# Altium footprint library Main.PcbLib: 50 footprints (part 3 of 4)
Each footprint in its own frame and in the unit in brackets; x right, y up, seen from the top. Pads: shape width x height; smd on the part's side, far side on the other; paste and mask are expansions set on the pad; w line width, h text height; cw(c..) or ccw(c..) is an arc to the next point about the centre after c.
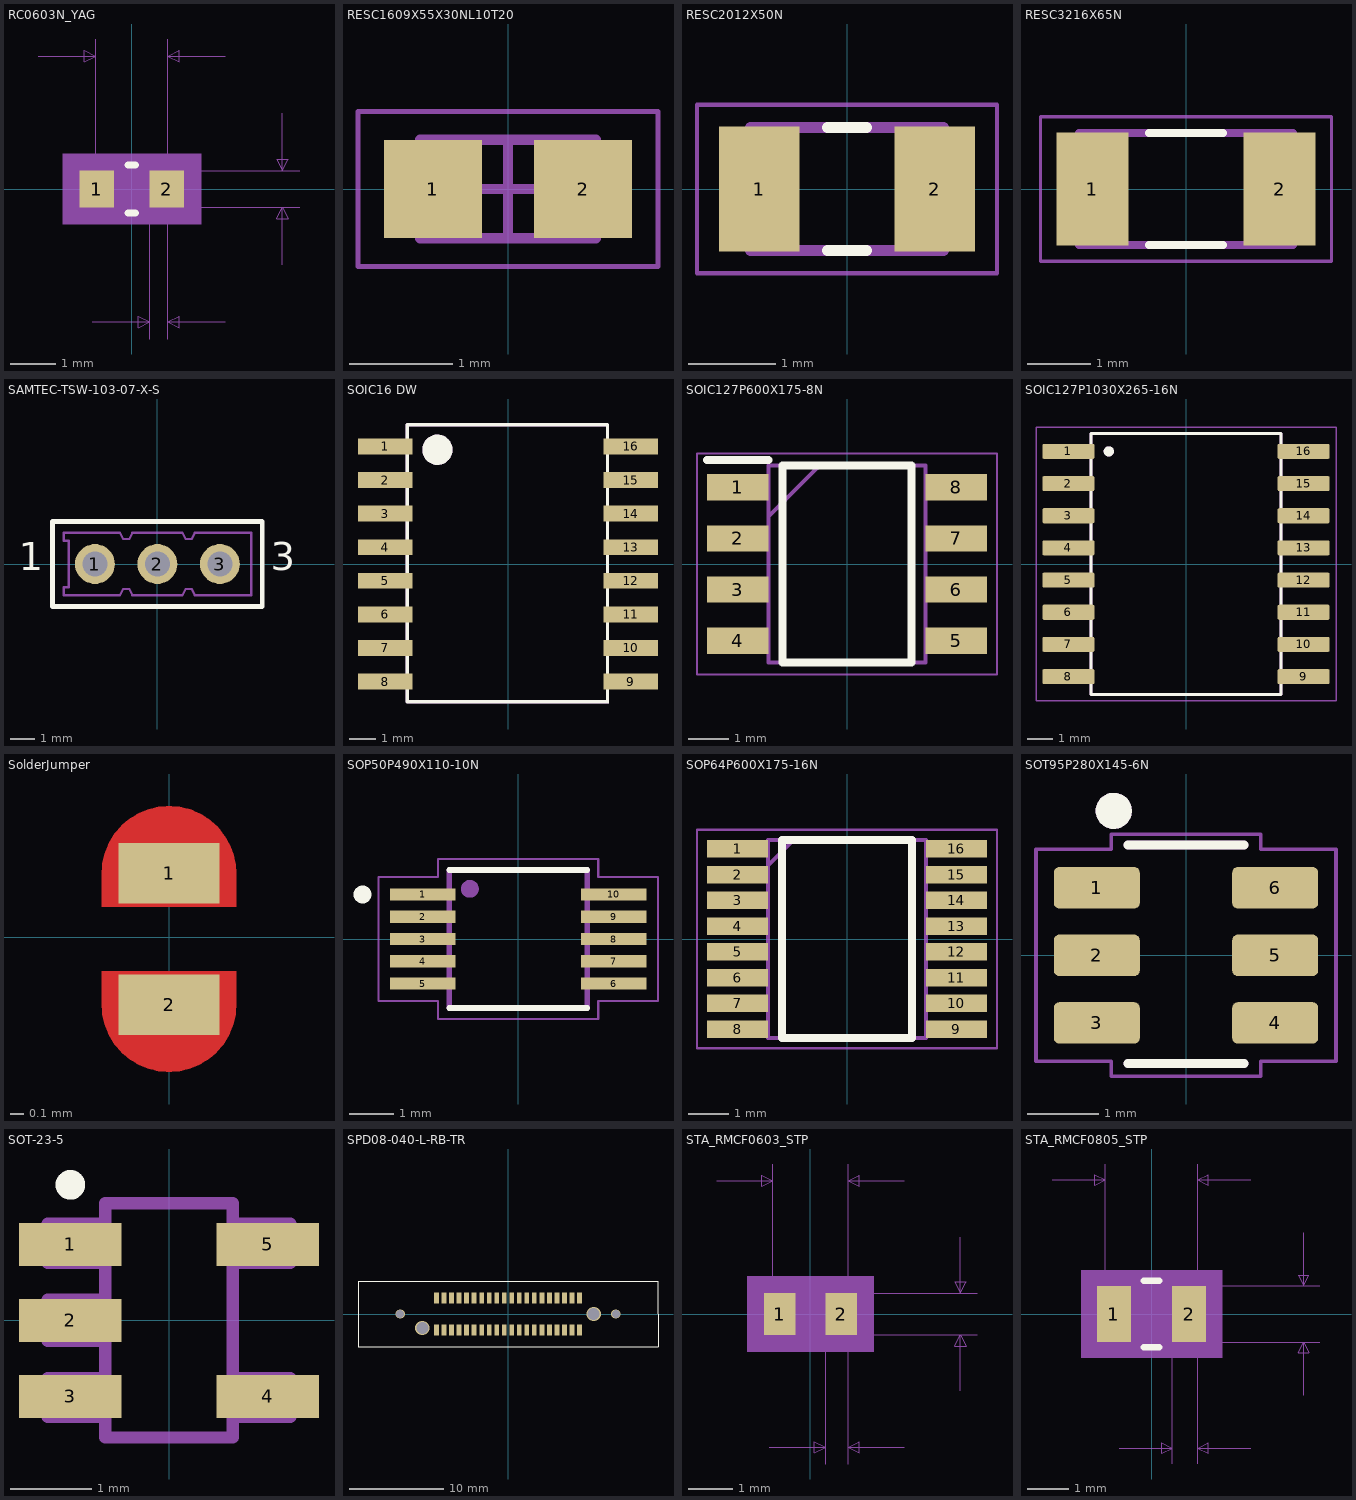
[diagram p2: the footprints below, top view; thin cyan lines are the x and y axes]

## RC0603N_YAG [mil]
pads (2):
  rect 30x32 smd paste+0 mask+0: 1(-30.5,0) 2(30.5,0)
Top Overlay:
  lines w6: -3.39,-21 3.39,-21 ; -3.39,21 3.39,21
Mechanical 5:
  region: 60.5,-31 -60.5,-31 -60.5,31 60.5,31
Mechanical 7:
  lines w1: -81.5,116 -31.5,116 ; -34.5,-116 15.5,-116 ; -31.5,0 -31.5,131 ; 0,-16 146.5,-16 ; 0,16 146.5,16 ; 15.5,-131 15.5,0 ; 31.5,-131 31.5,0 31.5,131 ; 81.5,-116 31.5,-116 ; 81.5,116 31.5,116 ; 131.5,-66 131.5,-16 ; 131.5,66 131.5,16 ; -31.5,116 -41.5,121 -41.5,111 -31.5,116 ; 15.5,-116 5.5,-111 5.5,-121 15.5,-116 ; 31.5,-116 41.5,-111 41.5,-121 31.5,-116 ; 31.5,116 41.5,121 41.5,111 31.5,116 ; 131.5,-16 126.5,-26 136.5,-26 131.5,-16 ; 131.5,16 126.5,26 136.5,26 131.5,16
  text "Default Padstyle: RX30Y32D0T" at -350,-286 h50
  text "Alternate 1 Padstyle: OX60Y90D30P" at -412.5,-386 h50
  text "Alternate 2 Padstyle: OX90Y60D30P" at -412.5,-486 h50
  text "0.032in/0.813mm" at 151.5,-12.5 h25
  text "0.063in/1.6mm" at -81.25,136 h25
  text "0.016in/0.406mm" at -70.25,-161 h25
Mechanical 13:
  lines w1: -31.5,-16 -31.5,16 ; -31.5,-16 -15.5,-16 -15.5,16 -31.5,16 ; -31.5,-16 31.5,-16 ; -31.5,-16 -31.5,16 ; -31.5,16 31.5,16 ; 31.5,-16 15.5,-16 15.5,16 31.5,16 ; 31.5,-16 31.5,16 ; 31.5,-16 31.5,16
Mechanical 15:
  region: 55.5,-26 -55.5,-26 -55.5,26 55.5,26
  lines w6: -55.5,-26 -55.5,26 55.5,26 55.5,-26 -55.5,-26
3D body: height 10, standoff 0, extent 0,0 10,10

## RESC1609X55X30NL10T20 [mm]
pads (2):
  rect 0.95x0.95 smd: 1(-0.725,0) 2(0.725,0)
Mechanical 13:
  lines w0.1: -0.85,-0.475 -0.85,0.475 0.85,0.475 0.85,-0.475 -0.85,-0.475
Mechanical 15:
  lines w0.05: -1.45,-0.75 -1.45,0.75 1.45,0.75 1.45,-0.75 -1.45,-0.75
  lines w0.1: -0.475,0 0.475,0 ; 0,-0.475 0,0.475
3D body: height 0.55, standoff 0, extent -0.55,-0.475 0.55,0.475
3D body: height 0.55, standoff 0, extent -0.85,-0.475 -0.55,0.475
3D body: height 0.55, standoff 0, extent 0.55,-0.475 0.85,0.475

## RESC2012X50N [mm]
pads (2):
  rect 0.92x1.42 smd: 1(-1,0) 2(1,0)
Top Overlay:
  lines w0.127: -0.22,-0.7 0.22,-0.7 ; -0.22,0.7 0.22,0.7
Mechanical 13:
  lines w0.127: -1.1,-0.7 -1.1,0.7 1.1,0.7 1.1,-0.7 -1.1,-0.7
Mechanical 15:
  lines w0.05: -1.71,-0.96 -1.71,0.96 1.71,0.96 1.71,-0.96 -1.71,-0.96

## RESC3216X65N [mm]
pads (2):
  rect 1.13x1.77 smd: 1(-1.47,0) 2(1.47,0)
Top Overlay:
  lines w0.127: -0.58,-0.88 0.58,-0.88 ; -0.58,0.88 0.58,0.88
Mechanical 13:
  lines w0.127: -1.68,-0.88 -1.68,0.88 1.68,0.88 1.68,-0.88 -1.68,-0.88
Mechanical 15:
  lines w0.05: -2.285,-1.135 -2.285,1.135 2.285,1.135 2.285,-1.135 -2.285,-1.135

## SAMTEC-TSW-103-07-X-S [mm]
pads (3):
  round 1.62 hole 1.02: 1(-2.54,0) 2(0,0) 3(2.54,0)
Top Overlay:
  lines w0.2: -4.26,-1.72 4.26,-1.72 4.26,1.72 -4.26,1.72 -4.26,-1.72
  text "3" at 4.601,-0.635 h1.97
  text "1" at -5.63,-0.635 h1.97
Top Solder:
  circle w0: c2.54,0 r0.861
  circle w0: c0,0 r0.861
  circle w0: c-2.54,0 r0.861
Bottom Solder:
  circle w0: c2.54,0 r0.861
  circle w0: c0,0 r0.861
  circle w0: c-2.54,0 r0.861
Mechanical 16:
  lines w0.1: -3.81,-1.27 -1.524,-1.27 -1.4,-1.016 -1.27,-1.016 -1.14,-1.016 -1.016,-1.27 1.016,-1.27 1.14,-1.016 1.27,-1.016 1.4,-1.016 1.524,-1.27 3.81,-1.27 3.81,1.27 1.524,1.27 1.4,1.016 1.27,1.016 1.14,1.016 1.016,1.27 -1.016,1.27 -1.14,1.016 -1.27,1.016 -1.4,1.016 -1.524,1.27 -3.81,1.27 -3.81,0.94 -3.607,0.94 -3.607,-0.94 -3.81,-0.94 -3.81,-1.27 ; -2.858,-0.318 -2.222,-0.318 -2.222,0.318 -2.858,0.318 -2.858,-0.318 ; -0.318,-0.318 0.318,-0.318 0.318,0.318 -0.318,0.318 -0.318,-0.318 ; 2.222,-0.318 2.858,-0.318 2.858,0.318 2.222,0.318 2.222,-0.318
  text "3" at 4.601,-0.635 h1.97
  text "1" at -5.63,-0.635 h1.97
Mechanical 42:
  lines w0.1: -4.26,-1.72 4.26,-1.72 4.26,1.72 -4.26,1.72 -4.26,-1.72
3D body "TSW-103-07-F-S.stp": height 7.89, standoff -3.04, extent -3.81,-1.27 3.937,1.27

## SOIC16 DW [mm]
pads (16):
  rect 2.06x0.6 smd: 1(-4.64,4.445) 2(-4.64,3.175) 3(-4.64,1.905) 4(-4.64,0.635) 5(-4.64,-0.635) 6(-4.64,-1.905) 7(-4.64,-3.175) 8(-4.64,-4.445) 9(4.64,-4.445) 10(4.64,-3.175) 11(4.64,-1.905) 12(4.64,-0.635) 13(4.64,0.635) 14(4.64,1.905) 15(4.64,3.175) 16(4.64,4.445)
Top Overlay:
  circle w0.635: c-2.667,4.318 r0.254
  lines w0: -3.8,-5.25 3.8,-5.25
  lines w0.127: -3.81,-5.209 3.759,-5.209 3.759,5.258 -3.81,5.258 -3.81,-5.209
Mechanical 4:
  lines w0: -3.8,-5.25 -3.8,5.25 ; -3.8,-5.25 3.8,-5.25 ; -3.8,-5.25 -3.8,5.25 ; -3.8,-5.25 3.8,-5.25 ; -3.8,5.25 3.8,5.25 ; -3.8,5.25 3.8,5.25 ; 3.8,-5.25 3.8,5.25 ; 3.8,-5.25 3.8,5.25
Mechanical 29:
  circle w0.635: c-2.667,4.318 r0.254
  lines w0: -3.8,-5.25 3.8,-5.25
  lines w0.127: -3.81,-5.209 3.759,-5.209 3.759,5.258 -3.81,5.258 -3.81,-5.209
  text "'.Designator'String" at -3.456,-4.62 h0.7
3D body "ISO7240ADW.STEP": height 2.36, standoff -0.29, extent -5.15,-5.15 5.15,5.15

## SOIC127P600X175-8N [mm]
pads (8):
  rect 1.525x0.65 smd: 1(-2.712,1.905) 2(-2.712,0.635) 3(-2.712,-0.635) 4(-2.712,-1.905) 5(2.712,-1.905) 6(2.712,-0.635) 7(2.712,0.635) 8(2.712,1.905)
Top Overlay:
  lines w0.2: -3.475,2.58 -1.95,2.58 ; -1.6,-2.45 1.6,-2.45 1.6,2.45 -1.6,2.45 -1.6,-2.45
Mechanical 13:
  lines w0.1: -1.95,1.18 -0.68,2.45 ; -1.95,-2.45 1.95,-2.45 1.95,2.45 -1.95,2.45 -1.95,-2.45
Mechanical 15:
  lines w0.05: -3.725,-2.75 3.725,-2.75 3.725,2.75 -3.725,2.75 -3.725,-2.75
3D body "NE555DR.stp": height 1.75, standoff 0, extent -3,-2.45 3,2.45

## SOIC127P1030X265-16N [mm]
pads (16):
  rrect25% 2.06x0.6 smd: 1(-4.64,4.445) 2(-4.64,3.175) 3(-4.64,1.905) 4(-4.64,0.635) 5(-4.64,-0.635) 6(-4.64,-1.905) 7(-4.64,-3.175) 8(-4.64,-4.445) 9(4.64,-4.445) 10(4.64,-3.175) 11(4.64,-1.905) 12(4.64,-0.635) 13(4.64,0.635) 14(4.64,1.905) 15(4.64,3.175) 16(4.64,4.445)
Top Overlay:
  circle w0.2: c-3.048,4.445 r0.1
  lines w0.127: -3.75,-5.15 -3.75,5.15 3.75,5.15 3.75,-5.15 -3.75,-5.15
Mechanical 13:
  circle w0.2: c-3.048,4.445 r0.1
  lines w0.127: -3.75,-5.15 -3.75,5.15 3.75,5.15 3.75,-5.15 -3.75,-5.15
Mechanical 15:
  lines w0.05: -5.92,-5.4 -5.92,5.4 5.92,5.4 5.92,-5.4 -5.92,-5.4
Mechanical 29:
  circle w0.2: c-3.048,4.445 r0.1
  lines w0.127: -3.75,-5.15 -3.75,5.15 3.75,5.15 3.75,-5.15 -3.75,-5.15
  text "'.Designator'String" at -3.456,-4.62 h0.7
3D body "ISO7710DW.STEP": height 2.36, standoff -0.29, extent -5.15,-5.15 5.15,5.15

## SolderJumper [mil]
pads (2):
  rect 30x18 smd paste+0 mask+0: 1(0,19) 2(0,-20)
Top Layer:
  region: 20,-10 -20,-10 -20,-20 20,-20
  rectangle: -20,9 20,19
  region: -15,-20 -10,-20 0,-10 10,-10 10,-26.03 12.4,-28.44 6.94,-33.9 -5.64,-33.9
  region: -3.62,33.56 -15,22.17 -15,19 20,9 8.19,25.81 8.19,31.57
  lines w10: -15,-20 ccw(c0,-20) -10.61,-30.6 ; -15,19 cw(c0,19) 0,34 cw(c0,19) 13.75,25 cw(c0,19) 15,19 ; 15,-20 cw(c0,-20) 0,-35 cw(c0,-20) -10.6,-30.61 ; -10.61,-30.6 ccw(c0,-20) -10.61,-30.61 ; -10.61,-30.61 ccw(c0,-20) -10.6,-30.61
Top Solder:
  region: 25,-6 25,-30 10,-45 -10,-45 -15,-40 -25,-30 -25,-6
  region: -25,5 -25,29 -10,44 10,44 15,39 25,29 25,5

## SOP50P490X110-10N [mm]
pads (10):
  rect 1.47x0.28 smd mask+0.04: 1(-2.15,1) 2(-2.15,0.5) 3(-2.15,0) 4(-2.15,-0.5) 5(-2.15,-1) 6(2.15,-1) 7(2.15,-0.5) 8(2.15,0) 9(2.15,0.5) 10(2.15,1)
Top Overlay:
  circle w0.2: c-3.5,1 r0.1
  lines w0.127: -1.55,-1.55 1.55,-1.55 ; -1.55,1.55 1.55,1.55
Mechanical 13:
  circle w0.2: c-1.087,1.127 r0.1
  lines w0.127: -1.55,-1.55 -1.55,1.55 1.55,1.55 1.55,-1.55 -1.55,-1.55
Mechanical 15:
  lines w0.05: -3.14,-1.39 -3.14,1.39 -1.8,1.39 -1.8,1.8 1.8,1.8 1.8,1.39 3.14,1.39 3.14,-1.39 1.8,-1.39 1.8,-1.8 -1.8,-1.8 -1.8,-1.39 -3.14,-1.39

## SOP64P600X175-16N [mm]
pads (16):
  rect 1.5x0.435 smd mask+0.025: 1(-2.7,2.222) 2(-2.7,1.588) 3(-2.7,0.952) 4(-2.7,0.318) 5(-2.7,-0.318) 6(-2.7,-0.952) 7(-2.7,-1.588) 8(-2.7,-2.222) 9(2.7,-2.222) 10(2.7,-1.588) 11(2.7,-0.952) 12(2.7,-0.318) 13(2.7,0.318) 14(2.7,0.952) 15(2.7,1.588) 16(2.7,2.222)
Top Overlay:
  lines w0.2: -1.6,-2.445 -1.6,2.445 1.6,2.445 1.6,-2.445 -1.6,-2.445
Mechanical 13:
  lines w0.1: -1.95,1.81 -1.315,2.445 ; -1.95,-2.445 -1.95,2.445 1.95,2.445 1.95,-2.445 -1.95,-2.445
Mechanical 15:
  lines w0.05: -3.7,-2.695 -3.7,2.695 3.7,2.695 3.7,-2.695 -3.7,-2.695
3D body "SI8640BA-B-IU.stp": height 1.75, standoff 0, extent -3,-2.445 3,2.445

## SOT95P280X145-6N [mm]
pads (6):
  rrect25% 1.21x0.58 smd: 1(-1.255,0.95) 2(-1.255,0) 3(-1.255,-0.95) 4(1.255,-0.95) 5(1.255,0) 6(1.255,0.95)
Top Overlay:
  circle w0.254: c-1.016,2.032 r0.127
  lines w0.127: -0.813,-1.524 0.813,-1.524 ; -0.813,1.549 0.813,1.549
Mechanical 13:
  circle w0.254: c-1.016,2.032 r0.127
  lines w0.127: -0.813,-1.524 0.813,-1.524 ; -0.813,1.549 0.813,1.549
Mechanical 15:
  lines w0.05: -2.11,-1.49 -2.11,1.49 -1.05,1.49 -1.05,1.7 1.05,1.7 1.05,1.49 2.11,1.49 2.11,-1.49 1.05,-1.49 1.05,-1.7 -1.05,-1.7 -1.05,-1.49 -2.11,-1.49
Mechanical 29:
  circle w0.254: c-1.016,2.032 r0.127
  lines w0.127: -0.813,-1.524 0.813,-1.524 ; -0.813,1.549 0.813,1.549
  text "'.Designator'String" at -0.713,-1.115 h0.7
3D body "DBV0006A.stp": height 1.2, standoff 0, extent -1.4,-1.45 1.4,1.45

## SOT-23-5 [mil]
pads (5):
  rect 50x21 smd: 1(-48,37) 2(-48,0) 3(-48,-37) 4(48,-37) 5(48,37)
Top Overlay:
  circle w10: c-48,66 r2.24
Mechanical 4:
  lines w6: -59,-47 -59,-28 ; -59,-47 -31,-47 ; -59,-47 -59,-28 ; -59,-47 -31,-47 ; -59,-28 -31,-28 ; -59,-28 -31,-28 ; -59,-10 -59,10 ; -59,-10 -31,-10 ; -59,-10 -59,10 ; -59,-10 -31,-10 ; -59,10 -31,10 ; -59,10 -31,10 ; -59,28 -59,47 ; -59,28 -31,28 ; -59,28 -59,47 ; -59,28 -31,28 ; -59,47 -31,47 ; -59,47 -31,47 ; -31,-57 31,-57 ; -31,-57 -31,57 ; -31,-57 31,-57 ; -31,-57 -31,57 ; -31,-47 -31,-28 ; -31,-47 -31,-28 ; -31,-10 -31,10 ; -31,-10 -31,10 ; -31,28 -31,47 ; -31,28 -31,47 ; -31,57 31,57 ; -31,57 31,57 ; 31,-57 31,57 ; 31,-57 31,57 ; 31,-47 31,-28 ; 31,-47 59,-47 ; 31,-47 31,-28 ; 31,-47 59,-47 ; 31,-28 59,-28 ; 31,-28 59,-28 ; 31,28 31,47 ; 31,28 59,28 ; 31,28 31,47 ; 31,28 59,28 ; 31,47 59,47 ; 31,47 59,47 ; 59,-47 59,-28 ; 59,-47 59,-28 ; 59,28 59,47 ; 59,28 59,47
3D body "SOT-23-5.STEP": height 51.68, standoff -5.41, extent -55.12,-57.1 55.12,57.08

## SPD08-040-L-RB-TR [mm]
pads (40):
  rect 0.5x1.2 smd mask+0.05: 1(-7.6,1.7) 2(-6.8,1.7) 3(-6,1.7) 4(-5.2,1.7) 5(-4.4,1.7) 6(-3.6,1.7) 7(-2.8,1.7) 8(-2,1.7) 9(-1.2,1.7) 10(-0.4,1.7) 11(0.4,1.7) 12(1.2,1.7) 13(2,1.7) 14(2.8,1.7) 15(3.6,1.7) 16(4.4,1.7) 17(5.2,1.7) 18(6,1.7) 19(6.8,1.7) 20(7.6,1.7) 21(7.6,-1.7) 22(6.8,-1.7) 23(6,-1.7) 24(5.2,-1.7) 25(4.4,-1.7) 26(3.6,-1.7) 27(2.8,-1.7) 28(2,-1.7) 29(1.2,-1.7) 30(0.4,-1.7) 31(-0.4,-1.7) 32(-1.2,-1.7) 33(-2,-1.7) 34(-2.8,-1.7) 35(-3.6,-1.7) 36(-4.4,-1.7) 37(-5.2,-1.7) 38(-6,-1.7) 39(-6.8,-1.7) 40(-7.6,-1.7)
via 9.1,0 diameter 1.5 hole 1.27
via -9.1,-1.5 diameter 1.5 hole 1.27
via 11.45,0 diameter 1 hole 0.84
via -11.45,0 diameter 1 hole 0.84
Top Overlay:
  lines w0.127: -15.925,-3.5 15.925,-3.5 15.925,3.5 -15.925,3.5 -15.925,-3.5
3D body "SPD08-040-L-XX-XX.STEP": height 12.22, standoff -1.49, extent -15.931,-3.525 15.919,3.475

## STA_RMCF0603_STP [mil]
pads (2):
  rect 28x37 smd paste+0 mask+0: 1(-27.5,0) 2(27.5,0)
Mechanical 5:
  region: 56.5,-33.5 -56.5,-33.5 -56.5,33.5 56.5,33.5
Mechanical 7:
  lines w1: -83.5,118.5 -33.5,118.5 ; -36.5,-118.5 13.5,-118.5 ; -33.5,0 -33.5,133.5 ; 0,-18.5 148.5,-18.5 ; 0,18.5 148.5,18.5 ; 13.5,-133.5 13.5,0 ; 33.5,-133.5 33.5,0 33.5,133.5 ; 83.5,-118.5 33.5,-118.5 ; 83.5,118.5 33.5,118.5 ; 133.5,-68.5 133.5,-18.5 ; 133.5,68.5 133.5,18.5 ; -33.5,118.5 -43.5,123.5 -43.5,113.5 -33.5,118.5 ; 13.5,-118.5 3.5,-113.5 3.5,-123.5 13.5,-118.5 ; 33.5,-118.5 43.5,-113.5 43.5,-123.5 33.5,-118.5 ; 33.5,118.5 43.5,123.5 43.5,113.5 33.5,118.5 ; 133.5,-18.5 128.5,-28.5 138.5,-28.5 133.5,-18.5 ; 133.5,18.5 128.5,28.5 138.5,28.5 133.5,18.5
  text "Default Padstyle: RX28Y37D0T" at -350,-288.5 h50
  text "Alt 1 Padstyle: OX60Y90D30P" at -337.5,-348.5 h50
  text "Alt 2 Padstyle: OX90Y60D30P" at -337.5,-408.5 h50
  text "0.037in/0.94mm" at 153.5,-12.5 h25
  text "0.067in/1.702mm" at -93.75,138.5 h25
  text "0.02in/0.508mm" at -64,-163.5 h25
Mechanical 13:
  lines w1: -33.5,-18.5 -33.5,18.5 ; -33.5,-18.5 -13.5,-18.5 -13.5,18.5 -33.5,18.5 ; -33.5,-18.5 33.5,-18.5 ; -33.5,-18.5 -33.5,18.5 ; -33.5,18.5 33.5,18.5 ; 33.5,-18.5 13.5,-18.5 13.5,18.5 33.5,18.5 ; 33.5,-18.5 33.5,18.5 ; 33.5,-18.5 33.5,18.5
Mechanical 15:
  region: 51.5,-28.5 -51.5,-28.5 -51.5,28.5 51.5,28.5
  lines w6: -51.5,-28.5 -51.5,28.5 51.5,28.5 51.5,-28.5 -51.5,-28.5
3D body: height 10, standoff 0, extent 0,0 10,10

## STA_RMCF0805_STP [mil]
pads (2):
  rect 32x53 smd paste+0 mask+0: 1(-35.5,0) 2(35.5,0)
Top Overlay:
  lines w6: -7.39,-31.5 7.39,-31.5 ; -7.39,31.5 7.39,31.5
Mechanical 5:
  region: 66.5,-41.5 -66.5,-41.5 -66.5,41.5 66.5,41.5
Mechanical 7:
  lines w1: -93.5,126.5 -43.5,126.5 ; -43.5,0 -43.5,141.5 ; -30.5,-126.5 19.5,-126.5 ; 0,-26.5 158.5,-26.5 ; 0,26.5 158.5,26.5 ; 19.5,-141.5 19.5,0 ; 43.5,-141.5 43.5,0 43.5,141.5 ; 93.5,-126.5 43.5,-126.5 ; 93.5,126.5 43.5,126.5 ; 143.5,-76.5 143.5,-26.5 ; 143.5,76.5 143.5,26.5 ; -43.5,126.5 -53.5,121.5 -53.5,131.5 -43.5,126.5 ; 19.5,-126.5 9.5,-131.5 9.5,-121.5 19.5,-126.5 ; 43.5,-126.5 53.5,-131.5 53.5,-121.5 43.5,-126.5 ; 43.5,126.5 53.5,121.5 53.5,131.5 43.5,126.5 ; 143.5,-26.5 148.5,-36.5 138.5,-36.5 143.5,-26.5 ; 143.5,26.5 148.5,36.5 138.5,36.5 143.5,26.5
  text "0.024in/0.61mm" at -56,-171.5 h25
  text "0.087in/2.21mm" at -87.5,146.5 h25
  text "0.053in/1.346mm" at 163.5,-12.5 h25
  text "Alt 2 Padstyle: OX90Y60D30P" at -337.5,-416.5 h50
  text "Alt 1 Padstyle: OX60Y90D30P" at -337.5,-356.5 h50
  text "Default Padstyle: RX32Y53D0T" at -350,-296.5 h50
Mechanical 13:
  lines w1: -43.5,-26.5 -43.5,26.5 ; -43.5,-26.5 43.5,-26.5 ; -43.5,-26.5 -19.5,-26.5 -19.5,26.5 -43.5,26.5 ; -43.5,-26.5 -43.5,26.5 ; -43.5,26.5 43.5,26.5 ; 43.5,-26.5 43.5,26.5 ; 43.5,-26.5 43.5,26.5 ; 43.5,-26.5 19.5,-26.5 19.5,26.5 43.5,26.5
Mechanical 15:
  region: 61.5,-36.5 -61.5,-36.5 -61.5,36.5 61.5,36.5
  lines w6: -61.5,-36.5 61.5,-36.5 61.5,36.5 -61.5,36.5 -61.5,-36.5
3D body: height 10, standoff 0, extent 0,0 10,10